# Altium footprint library PCBKU.PcbLib: 197 footprints (part 8 of 13)
Each footprint in its own frame and in the unit in brackets; x right, y up, seen from the top. Pads: shape width x height; smd on the part's side, far side on the other; paste and mask are expansions set on the pad; w line width, h text height; cw(c..) or ccw(c..) is an arc to the next point about the centre after c.
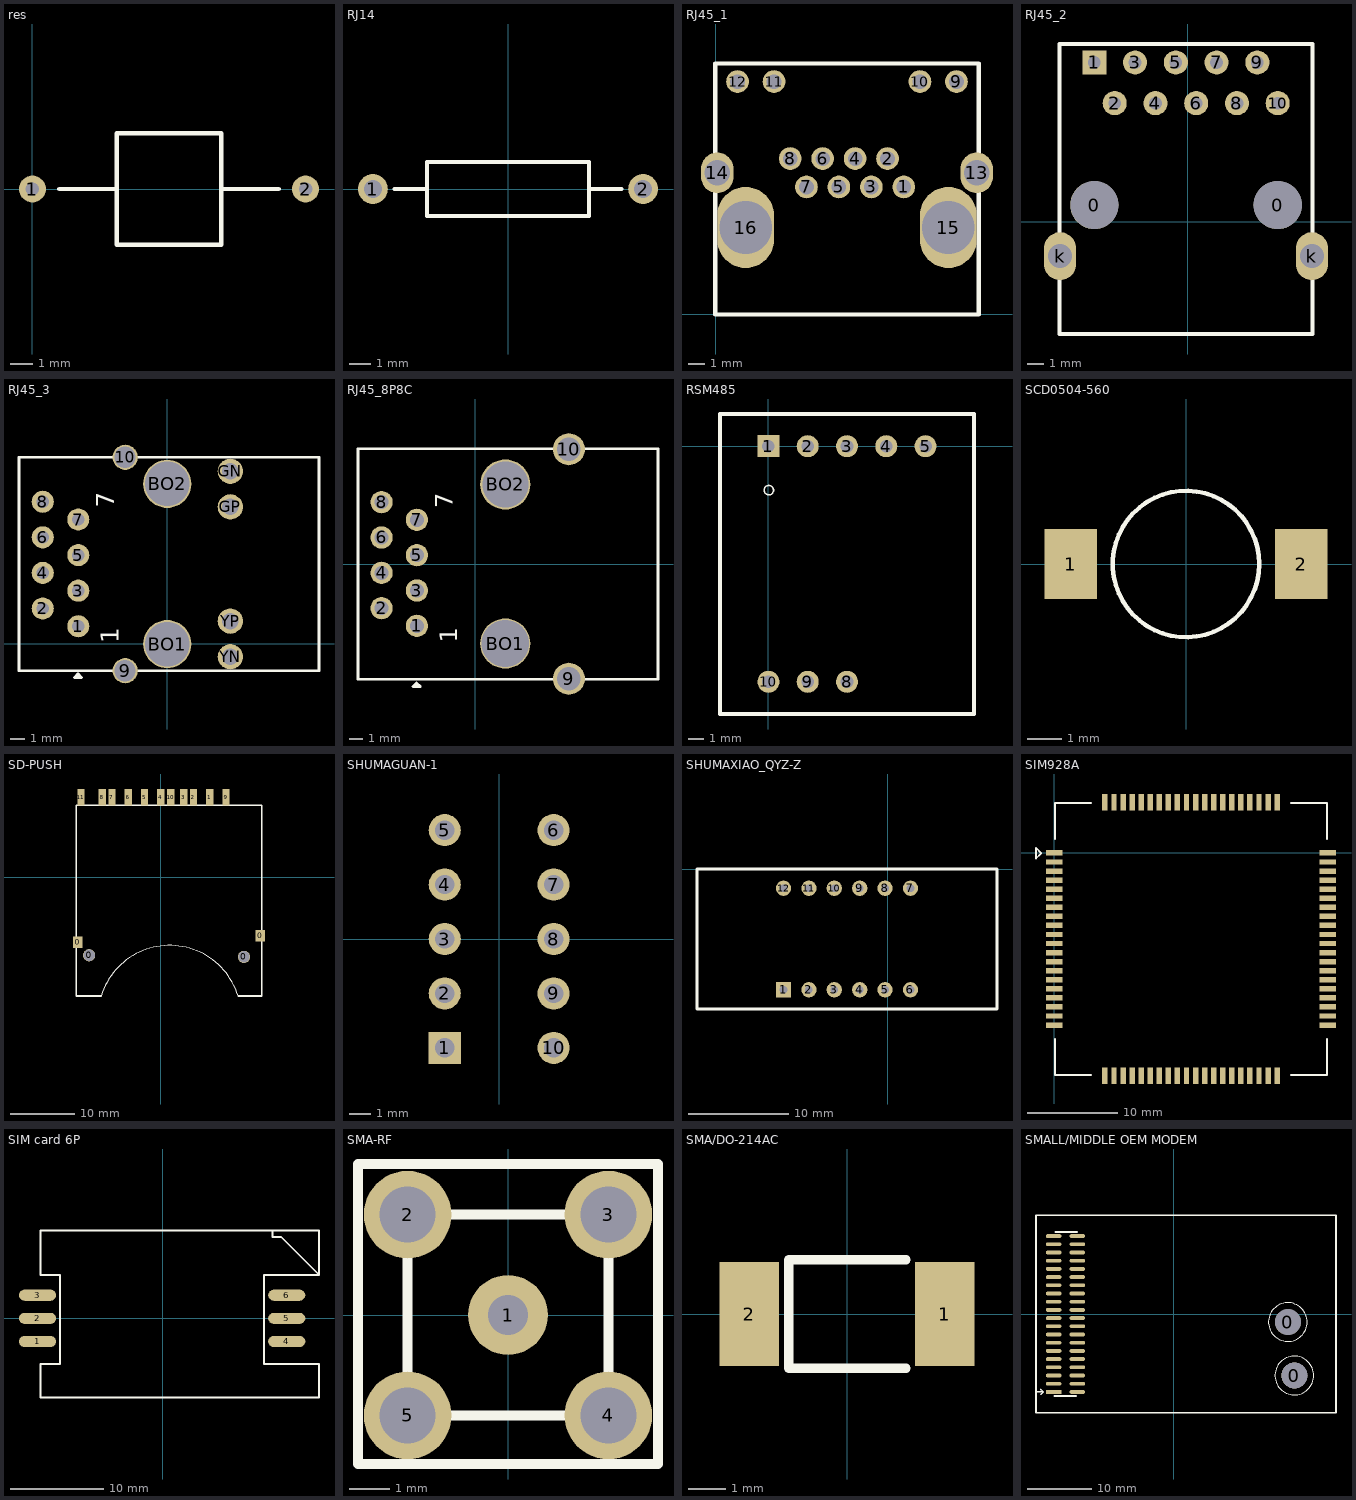
[diagram p7: the footprints below, top view; thin cyan lines are the x and y axes]

## res [mm]
pads (2):
  round 1.2 hole 0.6: 1(0,0) 2(12.2,0)
Top Overlay:
  lines w0.2: 1.2,0 3.775,0 ; 8.425,0 11,0 ; 3.775,0 3.775,-2.5 8.425,-2.5 8.425,2.5 3.775,2.5 3.775,0

## RJ14 [mm]
pads (2):
  round 1.4 hole 0.85: 1(-6.35,0) 2(6.35,0)
Top Overlay:
  lines w0.2: -5.334,0 -3.81,0 ; 3.81,0 5.334,0 ; -3.81,-1.27 -3.81,1.27 3.81,1.27 3.81,-1.27 -3.81,-1.27
3D body: height 4.08, standoff -5.3, extent -6.725,-1.981 6.725,1.769

## RJ45_1 [mil]
pads (16):
  round 56 hole 36: 1(464.02,314.02) 2(424.02,384.02) 3(384.02,314.02) 4(344.02,384.02) 5(304.02,314.02) 6(264.02,384.02) 7(224.02,314.02) 8(184.02,384.02) 9(594.02,574.02) 10(504.02,574.02) 11(144.02,574.02) 12(54.02,574.02)
  oval 80x100 hole 63: 13(644.02,349.02) 14(4.02,349.02)
  oval 140x200 hole 130: 15(574.02,214.02) 16(74.02,214.02)
Top Overlay:
  lines w10: -0.98,-0.98 -0.98,619.02 649.02,619.02 649.02,-0.98 -0.98,-0.98

## RJ45_2 [mm]
pads (14):
  round 3 hole 3: 0(-5.832,1.027) 0(5.598,1.027)
  rect 1.5x1.5 hole 0.8: 1(-5.832,9.917)
  round 1.5 hole 0.8: 2(-4.562,7.377) 3(-3.292,9.917) 4(-2.022,7.377) 5(-0.752,9.917) 6(0.518,7.377) 7(1.788,9.917) 8(3.058,7.377) 9(4.328,9.917) 10(5.598,7.377)
  oval 2x3 hole 1.5: k(-7.968,-2.162) k(7.732,-2.162)
Top Overlay:
  lines w0.254: -7.992,-7.013 -7.992,11.067 7.758,11.067 7.758,-7.013 -7.992,-7.013

## RJ45_3 [mil]
pads (16):
  round 62 hole 35: 1(-250.62,49.5) 2(-350.62,99.5) 3(-250.62,149.5) 4(-350.62,199.5) 5(-250.62,249.5) 6(-350.62,299.5) 7(-250.62,349.5) 8(-350.62,399.5)
  round 70.87 hole 59.06: 9(-118.73,-75.5) 10(-118.73,524.5)
  round 135 hole 125: BO1(-0.62,-0.5) BO2(-0.62,449.5)
  round 70.87 hole 47.24: GN(176.54,485.13) GP(176.54,385.13) YN(176.54,-36.13) YP(176.54,63.87)
Top Overlay:
  lines w8: -417.29,-75.5 425.82,-75.5 425.82,524.5 -417.29,524.5 -417.29,-75.5 ; -261.39,-94.04 -251.39,-84.04 -241.39,-94.04 -246.39,-94.04 -261.39,-94.04
  text "7" at -149.56,381.95 h50
  text "1" at -136.5,1.66 h50

## RJ45_8P8C [mm]
pads (12):
  round 1.6 hole 1: 1(-4.19,-4.445) 2(-6.73,-3.175) 3(-4.19,-1.905) 4(-6.73,-0.635) 5(-4.19,0.635) 6(-6.73,1.905) 7(-4.19,3.175) 8(-6.73,4.445)
  round 2.3 hole 1.7: 9(6.73,-8.245) 10(6.73,8.245)
  round 3.6 hole 3.4: BO1(2.16,-5.715)
  round 3.6 hole 3.3: BO2(2.16,5.715)
Top Overlay:
  lines w0.203: -8.423,-8.28 -8.423,8.28 13.133,8.28 13.133,-8.28 -8.423,-8.28 ; -4.463,-8.802 -4.082,-8.802 -3.955,-8.802 -4.209,-8.548 -4.463,-8.802
  text "1" at -1.291,-5.66 h1.27
  text "7" at -1.623,3.999 h1.27

## RSM485 [mil]
height 43.31
pads (8):
  rect 56x56 hole 32: 1(0,0)
  round 56 hole 32: 2(100,0) 3(200,0) 4(300,0) 5(400,0) 8(200,-600) 9(100,-600) 10(0,-600)
Top Overlay:
  circle w3.94: c1,-112 r12
  lines w9.84: -123,-682 523,-682 523,82 -123,82 -123,-682

## SCD0504-560 [mm]
pads (2):
  rect 1.5x2 smd: 1(-3.3,0) 2(3.3,0)
Top Overlay:
  circle w0.127: c0,0 r2.1

## SD-PUSH [mil]
height 43.31
pads (15):
  rect 60x70 smd: 0(-510,-400) 0(610,-360)
  round 75 hole 70: 0(-440,-480) 0(510,-490)
  rect 45x100 smd: 1(300,490) 2(200,490) 3(140,490) 4(0,490) 5(-100,490) 6(-200,490) 7(-300,490) 8(-360,490) 9(400,490) 10(60,490) 11(-490,490)
Top Overlay:
  lines w3.94: -366.09,-728.09 cw(c53.89,-860.24) 474.07,-728.73
  lines w9.84: -366.09,-730 -520,-730 -520,440 620,440 620,-730 474.07,-730 474.07,-728.73

## SHUMAGUAN-1 [mm]
pads (10):
  rect 1.5x1.5 hole 0.9: 1(-2.54,-5.08)
  round 1.5 hole 0.9: 2(-2.54,-2.54) 3(-2.54,0) 4(-2.54,2.54) 5(-2.54,5.08) 6(2.54,5.08) 7(2.54,2.54) 8(2.54,0) 9(2.54,-2.54) 10(2.54,-5.08)
Bottom Overlay:
  circle w0.25: c4.697,6.604 r0.125
  lines w0.2: -4,-7 4,-7 4,7 -4,7 -4,-7

## SHUMAXIAO_QYZ-Z [mil]
height 551.18
pads (12):
  rect 60x60 hole 30: 1(-410,-475.59)
  round 60 hole 30: 2(-310,-475.59) 3(-210,-475.59) 4(-110,-475.59) 5(-10,-475.59) 6(90,-475.59) 7(90,-75.59) 8(-10,-75.59) 9(-110,-75.59) 10(-210,-75.59) 11(-310,-75.59) 12(-410,-75.59)
Top Overlay:
  lines w10: -750.55,-551.18 -750.55,0 430.55,0 430.55,-551.18 -750.55,-551.18

## SIM928A [mm]
height 8.2
pads (80):
  rect 1.8x0.6 smd: 1(0,0) 2(0,-1) 3(0,-2) 4(0,-3) 5(0,-4) 6(0,-5) 7(0,-6) 8(0,-7) 9(0,-8) 10(0,-9) 11(0,-10) 12(0,-11) 13(0,-12) 14(0,-13) 15(0,-14) 16(0,-15) 17(0,-16) 18(0,-17) 19(0,-18) 20(0,-19) 41(30.2,-19) 42(30.2,-18) 43(30.2,-17) 44(30.2,-16) 45(30.2,-15) 46(30.2,-14) 47(30.2,-13) 48(30.2,-12) 49(30.2,-11) 50(30.2,-10) 51(30.2,-9) 52(30.2,-8) 53(30.2,-7) 54(30.2,-6) 55(30.2,-5) 56(30.2,-4) 57(30.2,-3) 58(30.2,-2) 59(30.2,-1) 60(30.2,0)
  rect 0.6x1.8 smd: 21(5.6,-24.6) 22(6.6,-24.6) 23(7.6,-24.6) 24(8.6,-24.6) 25(9.6,-24.6) 26(10.6,-24.6) 27(11.6,-24.6) 28(12.6,-24.6) 29(13.6,-24.6) 30(14.6,-24.6) 31(15.6,-24.6) 32(16.6,-24.6) 33(17.6,-24.6) 34(18.6,-24.6) 35(19.6,-24.6) 36(20.6,-24.6) 37(21.6,-24.6) 38(22.6,-24.6) 39(23.6,-24.6) 40(24.6,-24.6) 61(24.6,5.6) 62(23.6,5.6) 63(22.6,5.6) 64(21.6,5.6) 65(20.6,5.6) 66(19.6,5.6) 67(18.6,5.6) 68(17.6,5.6) 69(16.6,5.6) 70(15.6,5.6) 71(14.6,5.6) 72(13.6,5.6) 73(12.6,5.6) 74(11.6,5.6) 75(10.6,5.6) 76(9.6,5.6) 77(8.6,5.6) 78(7.6,5.6) 79(6.6,5.6) 80(5.6,5.6)
Top Overlay:
  lines w0.2: -1.463,-0.076 -2.007,-0.619 -2.007,0.567 -1.463,0.024 ; 0.1,-20.5 0.1,-24.5 4.1,-24.5 ; 0.1,1.5 0.1,5.5 4.1,5.5 ; 26.1,-24.5 30.1,-24.5 30.1,-20.5 ; 26.1,5.5 30.1,5.5 30.1,1.5

## SIM card 6P [mm]
pads (6):
  oval 4x1.2 smd: 1(-13.464,-2.489) 2(-13.464,0) 3(-13.464,2.489) 4(13.388,-2.489) 5(13.388,0) 6(13.388,2.489)
Top Overlay:
  lines w0.203: -13.136,4.686 -13.136,9.466 16.864,9.466 16.864,4.686 ; -13.123,4.672 -11.049,4.672 -11.049,-4.914 -13.136,-4.914 -13.136,-8.534 16.864,-8.534 16.864,-4.914 10.922,-4.914 10.922,4.686 16.864,4.686 ; 11.835,9.415 11.835,8.763 12.786,8.763 16.864,4.686

## SMA-RF [mm] "gps天线接口"
height 1.1
pads (5):
  round 2 hole 1: 1(0,0)
  round 2.2 hole 1.4: 2(-2.515,2.515) 3(2.515,2.515) 4(2.515,-2.515) 5(-2.515,-2.515)
Top Overlay:
  lines w0.254: -3.759,-3.734 3.759,-3.734 3.759,3.785 -3.759,3.785 -3.759,-3.734 ; -2.515,-2.515 2.515,-2.515 2.515,2.515 -2.515,2.515 -2.515,-2.515

## SMA/DO-214AC [mm]
pads (2):
  rect 1.6x2.8 smd: 1(2.623,0) 2(-2.623,0)
Top Overlay:
  lines w0.254: 1.582,-1.45 -1.568,-1.45 -1.568,1.45 1.582,1.45
3D body: height 2.24, standoff -0.04, extent -2.997,-1.346 2.489,1.448

## SMALL/MIDDLE OEM MODEM [mm]
pads (42):
  round 4 hole 4: 0(17.631,-1.25) 0(18.636,-9.525)
  rect 2.4x0.6 smd: 1(-18.636,-12.065)
  oval 2.4x0.6 smd: 2(-14.966,-12.065) 3(-18.636,-10.795) 4(-14.966,-10.795) 5(-18.636,-9.525) 6(-14.966,-9.525) 7(-18.636,-8.255) 8(-14.966,-8.255) 9(-18.636,-6.985) 10(-14.966,-6.985) 11(-18.636,-5.715) 12(-14.966,-5.715) 13(-18.636,-4.445) 14(-14.966,-4.445) 15(-18.636,-3.175) 16(-14.966,-3.175) 17(-18.636,-1.905) 18(-14.966,-1.905) 19(-18.636,-0.635) 20(-14.966,-0.635) 21(-18.636,0.635) 22(-14.966,0.635) 23(-18.636,1.905) 24(-14.966,1.905) 25(-18.636,3.175) 26(-14.966,3.175) 27(-18.636,4.445) 28(-14.966,4.445) 29(-18.636,5.715) 30(-14.966,5.715) 31(-18.636,6.985) 32(-14.966,6.985) 33(-18.636,8.255) 34(-14.966,8.255) 35(-18.636,9.525) 36(-14.966,9.525) 37(-18.636,10.795) 38(-14.966,10.795) 39(-18.636,12.065) 40(-14.966,12.065)
Top Overlay:
  circle w0.1: c18.636,-9.525 r3
  circle w0.1: c17.631,-1.25 r3
  lines w0.25: -21.369,-12.065 -20.541,-12.065 ; -20.607,-12.446 -20.226,-12.065 -20.607,-11.684 ; -18.509,-12.7 -15.109,-12.7 ; -18.401,12.7 -15.001,12.7
  lines w0.254: 25.063,-15.303 -21.369,-15.303 -21.369,15.303 25.088,15.303 25.088,-15.278 25.088,-12.949